# Altium schematic symbol library SignalCommunications.SCHLIB: 804 symbols (part 3 of 9) (continued)
## WE-RFI_1008 (continued)
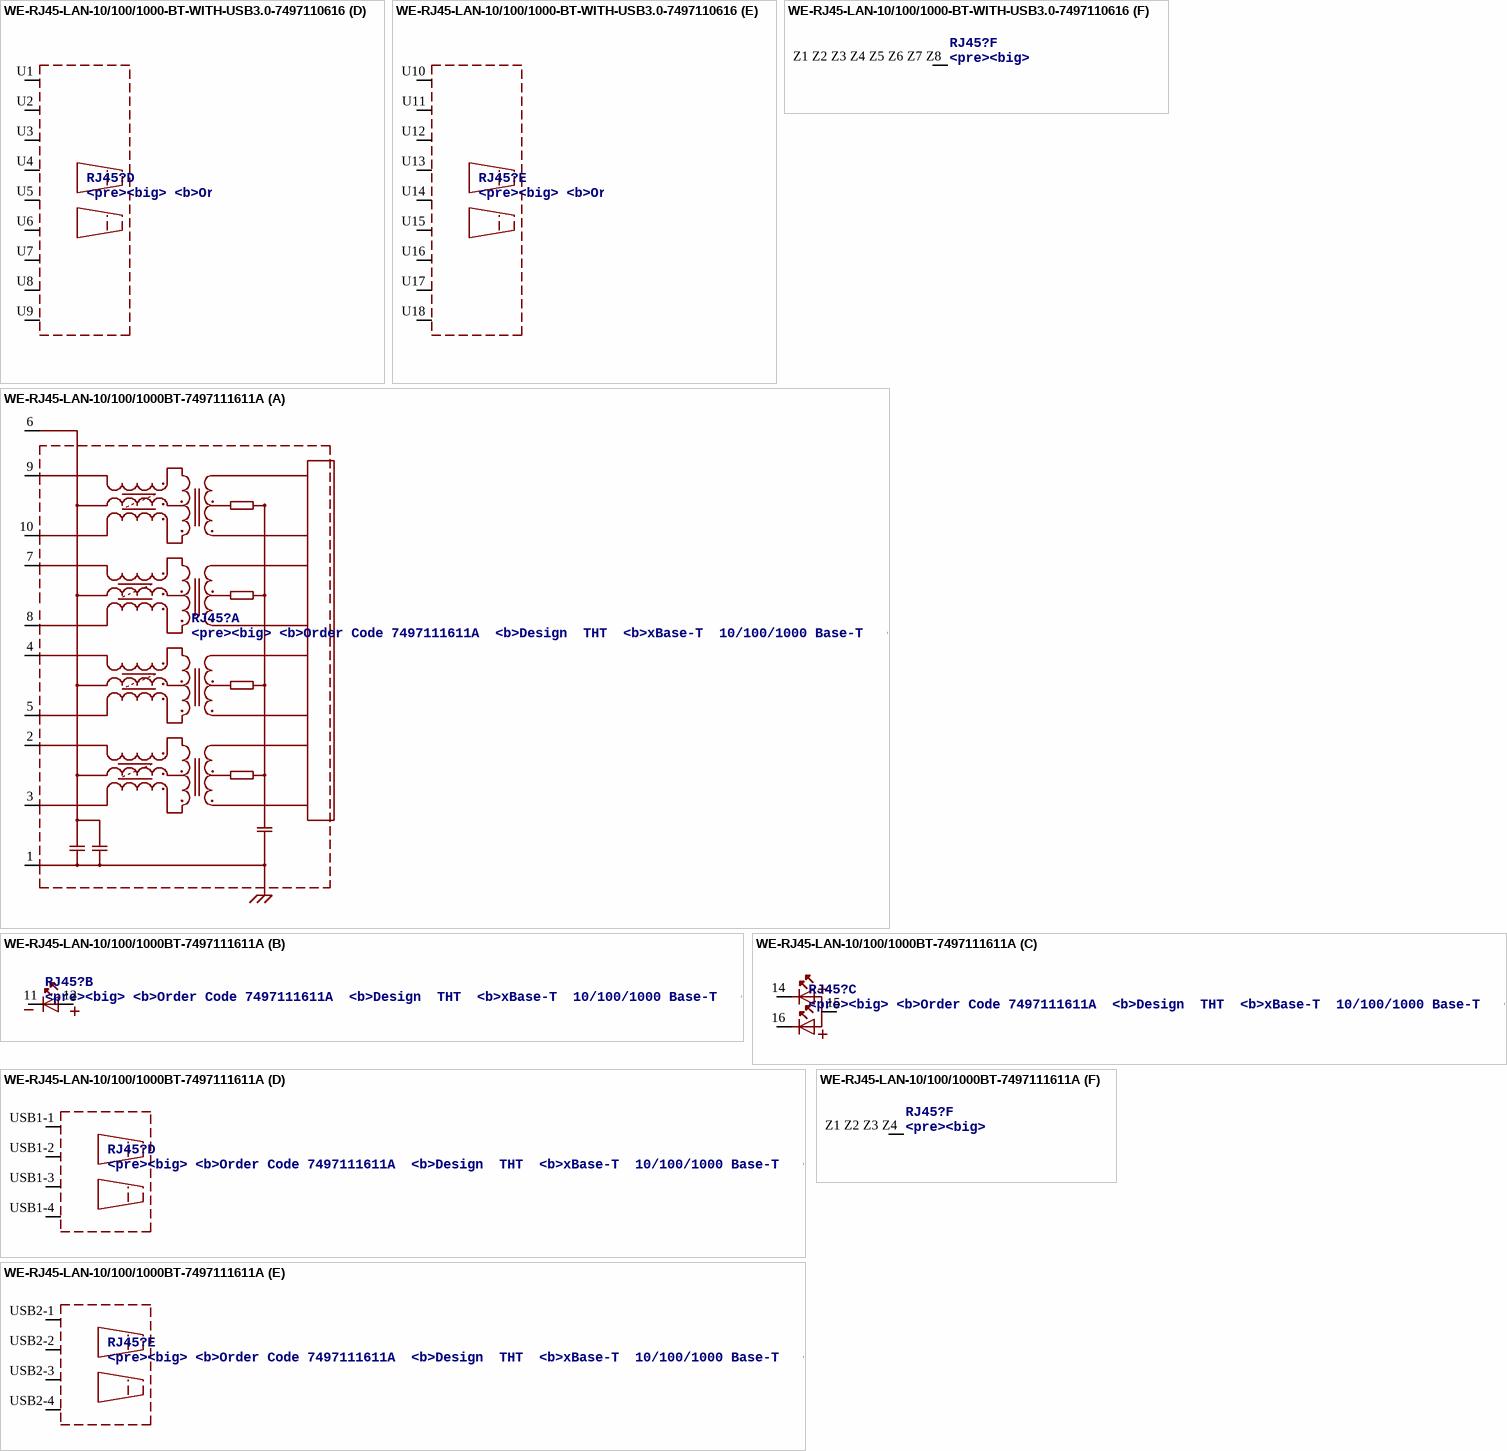
[diagram p12: symbols WE-RJ45-LAN-10/100/1000-BT-WITH-USB3.0-7497110616 to WE-RJ45-LAN-10/100/1000BT-7497111611A]

## WE-RJ45-LAN-10/100/1000-BT-WITH-USB3.0-7497110616
designator RJ45?, comment <pre><big> / <b>Order Code	7497110616 / <b>Design		THT / <b>xBase-T		10/100/1000 Base-T / <b>Ports		1x1 +2USB / <b>Application	Standard USB3.0 / <b>Tab Position	UP / <b>LED (Left-Right)	YELLOW-GREEN/OANGE / <b>EMI Fingers	NO
MANUFACTURER: Würth Elektronik eiSos GmbH; CREATED-BY: Christin Zierenner; COMPANY-URL: http://www.we-online.de; CREATED-DATE: AUG 2012; DATASHEET-URL: http://katalog.we-online.de/kataloge/eisos/media/pdf/7497110616.pdf
footprint 7497110616
part A pins: 1, 2, 3, 4, 5, 6, 7, 8, 9, 10 (power)
part B pins: 11 K, 12 A
part C pins: 13 AK1, 14 AK2
part D pins: U1 VCC (power), U2 D-, U3 D+, U4 GND (power), U5 RX-, U6 RX+, U7 GND_SIG (power), U8 TX-, U9 TX+
part E pins: U10 VCC (power), U11 D-, U12 D+, U13 GND (power), U14 RX-, U15 RX+, U16 GND_SIG (power), U17 TX-, U18 TX+
part F pins: Z1 Z2 Z3 Z4 Z5 Z6 Z7 Z8 P$1 (power)

## WE-RJ45-LAN-10/100/1000BT-7497111611A
designator RJ45?, comment <pre><big> / <b>Order Code	7497111611A / <b>Design		THT / <b>xBase-T		10/100/1000 Base-T / <b>Ports		1x1 + 2xUSB / <b>Application	Standard USB2.0 / <b>Tab Position	UP / <b>LED (Left-Right)	GREEN/ORANGE-YELLOW / <b>EMI Fingers	YES
MANUFACTURER: Würth Elektronik eiSos GmbH; CREATED-BY: Christin Zierenner; COMPANY-URL: http://www.we-online.de; CREATED-DATE: AUG 2012; DATASHEET-URL: http://katalog.we-online.de/kataloge/eisos/media/pdf/7497111611A.pdf
footprint 7497111611A
part A pins: 1 (power), 2, 3, 4, 5, 6, 7, 8, 9, 10
part B pins: 11 K, 12 A
part C pins: 14 K1, 15 A1, 16 K2
part D pins: USB1-1 VCC (power), USB1-2 D-, USB1-3 D+, USB1-4 GND (power)
part E pins: USB2-1 VCC (power), USB2-2 D-, USB2-3 D+, USB2-4 GND (power)
part F pins: Z1 Z2 Z3 Z4 P$1 (power)

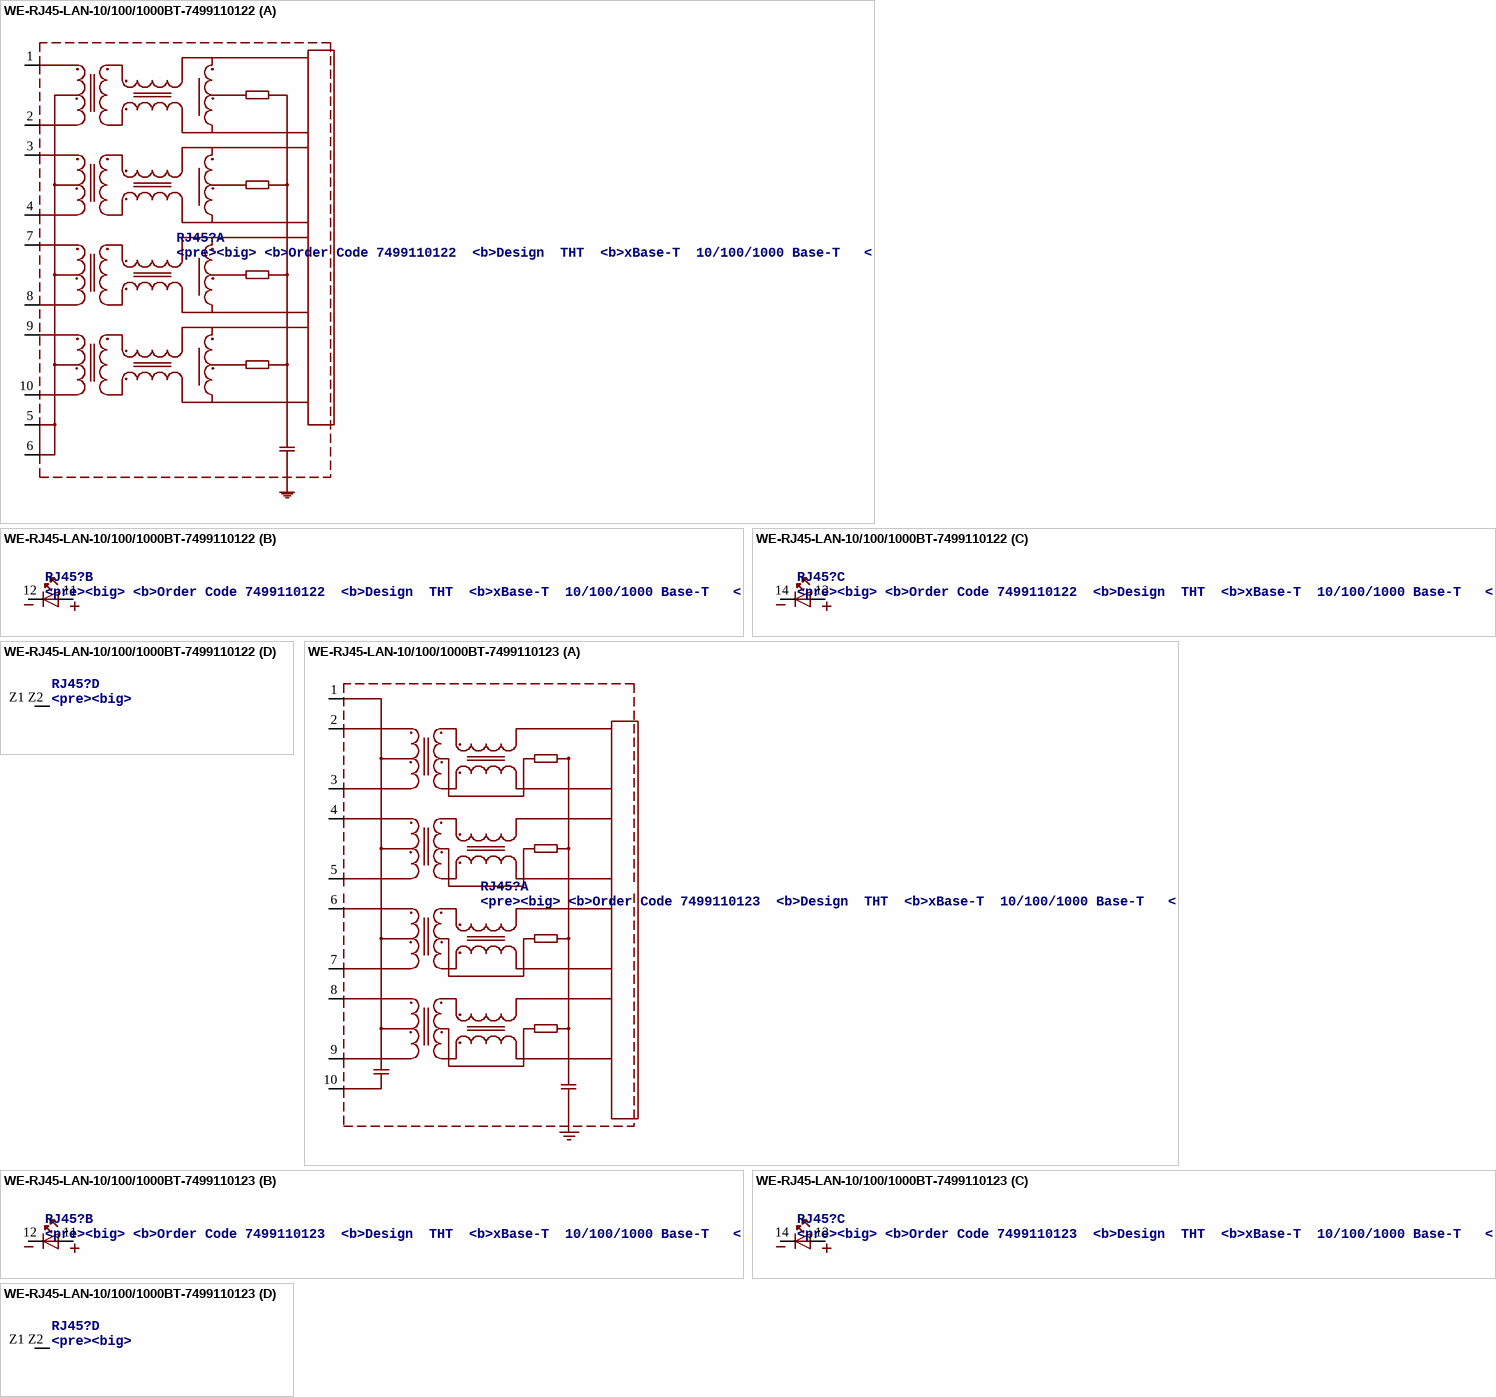
[diagram p13: symbols WE-RJ45-LAN-10/100/1000BT-7499110122 to WE-RJ45-LAN-10/100/1000BT-7499110123]

## WE-RJ45-LAN-10/100/1000BT-7499110122
designator RJ45?, comment <pre><big> / <b>Order Code	7499110122 / <b>Design		THT / <b>xBase-T		10/100/1000 Base-T / <b>Ports		1x1 / <b>Application	Standard / <b>Tab Position	Down / <b>LED (Left-Right)	YELLOW-GREEN / <b>EMI Fingers	No
MANUFACTURER: Würth Elektronik eiSos GmbH; CREATED-BY: Christin Zierenner; COMPANY-URL: http://www.we-online.de; CREATED-DATE: AUG 2012; DATASHEET-URL: http://katalog.we-online.de/kataloge/eisos/media/pdf/7499110122.pdf
footprint 7499110122
part A pins: 1, 2, 3, 4, 5, 6, 7, 8, 9, 10
part B pins: 11 A, 12 K
part C pins: 13 A, 14 K
part D pins: Z1 Z2 P$1 (power)

## WE-RJ45-LAN-10/100/1000BT-7499110123
designator RJ45?, comment <pre><big> / <b>Order Code	7499110123 / <b>Design		THT / <b>xBase-T		10/100/1000 Base-T / <b>Ports		1x1 / <b>Application	Standard / <b>Tab Position	VERTICAL / <b>LED (Left-Right)	YELLOW-GREEN / <b>EMI Fingers	No
MANUFACTURER: Würth Elektronik eiSos GmbH; CREATED-BY: Christin Zierenner; COMPANY-URL: http://www.we-online.de; CREATED-DATE: AUG 2012; DATASHEET-URL: http://katalog.we-online.de/kataloge/eisos/media/pdf/7499110123.pdf
footprint 7499110123
part A pins: 1, 2, 3, 4, 5, 6, 7, 8, 9, 10
part B pins: 11 A, 12 K
part C pins: 13 A, 14 K
part D pins: Z1 Z2 P$1 (power)

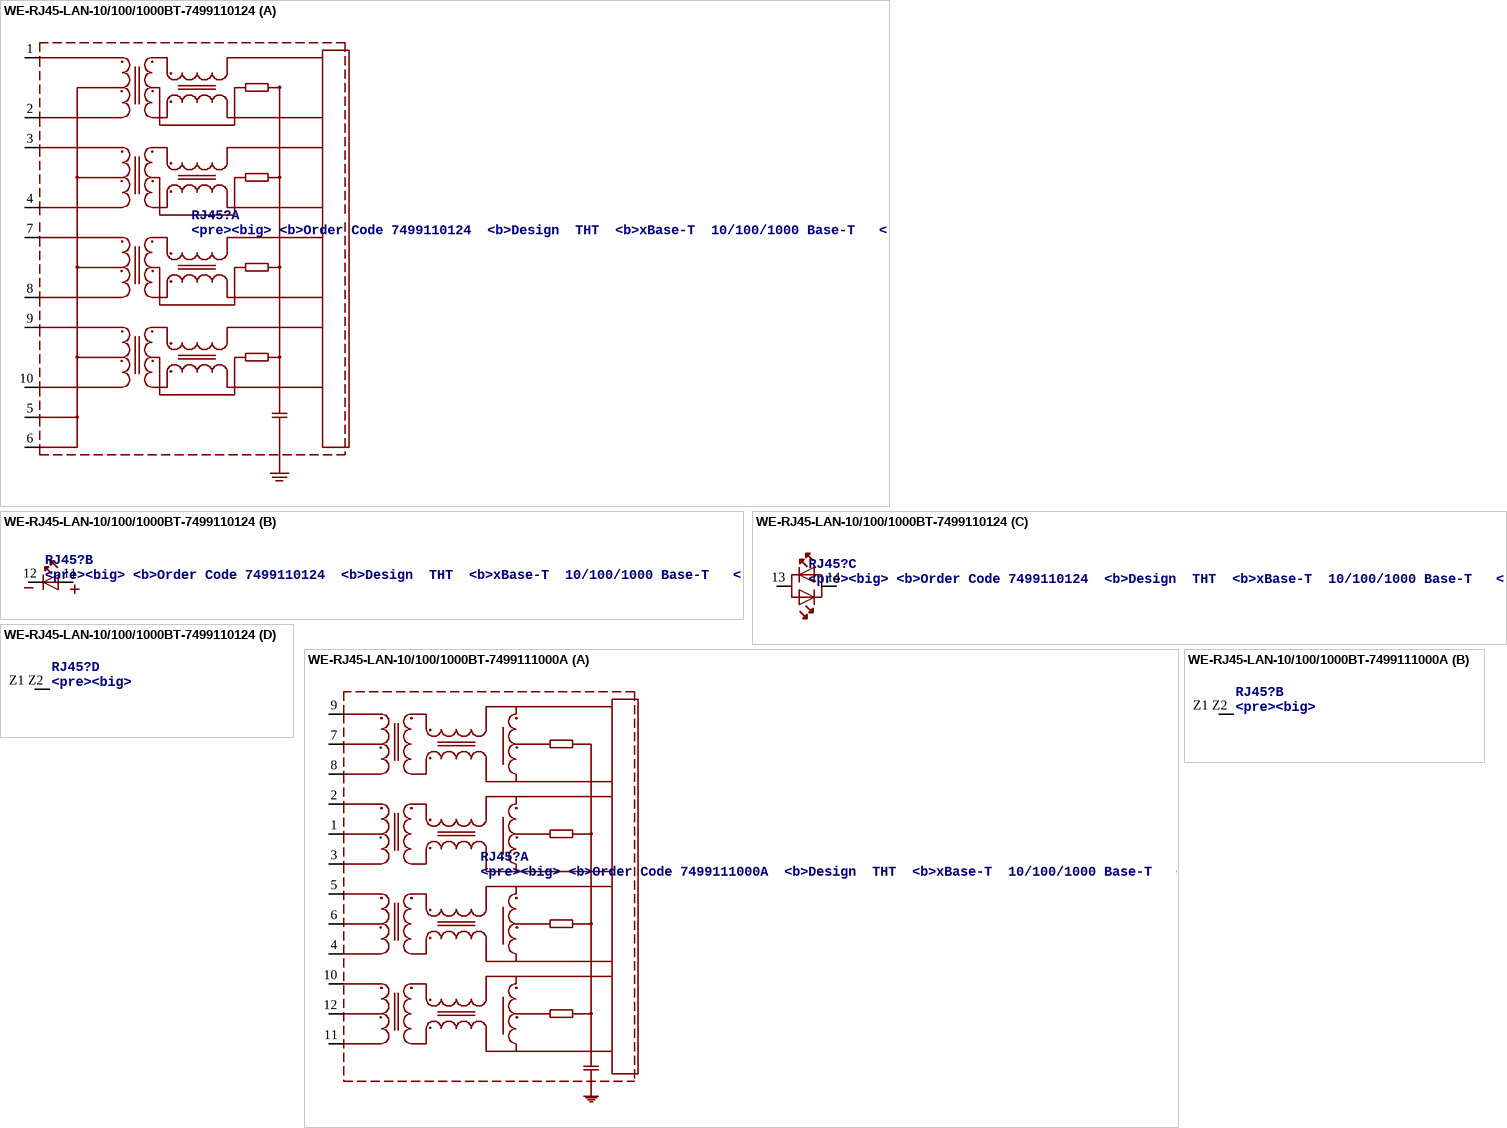
[diagram p14: symbols WE-RJ45-LAN-10/100/1000BT-7499110124 to WE-RJ45-LAN-10/100/1000BT-7499111000A]

## WE-RJ45-LAN-10/100/1000BT-7499110124
designator RJ45?, comment <pre><big> / <b>Order Code	7499110124 / <b>Design		THT / <b>xBase-T		10/100/1000 Base-T / <b>Ports		1x1 / <b>Application	Standard / <b>Tab Position	UP / <b>LED (Left-Right)	GREEN/YELLOW-GREEN / <b>EMI Fingers	No
MANUFACTURER: Würth Elektronik eiSos GmbH; CREATED-BY: Christin Zierenner; COMPANY-URL: http://www.we-online.de; CREATED-DATE: AUG 2012; DATASHEET-URL: http://katalog.we-online.de/kataloge/eisos/media/pdf/7499110124.pdf
footprint 7499110124
part A pins: 1, 2, 3, 4, 5, 6, 7, 8, 9, 10
part B pins: 11 A, 12 K
part C pins: 13 AK1, 14 AK2
part D pins: Z1 Z2 P$1 (power)

## WE-RJ45-LAN-10/100/1000BT-7499111000A
designator RJ45?, comment <pre><big> / <b>Order Code	7499111000A / <b>Design		THT / <b>xBase-T		10/100/1000 Base-T / <b>Ports		1x1 / <b>Application	Standard / <b>Tab Position	UP / <b>LED (Left-Right)	NONE / <b>EMI Fingers	Yes
MANUFACTURER: Würth Elektronik eiSos GmbH; CREATED-BY: Christin Zierenner; COMPANY-URL: http://www.we-online.de; CREATED-DATE: AUG 2012; DATASHEET-URL: http://katalog.we-online.de/kataloge/eisos/media/pdf/7499111000A.pdf
footprint 7499111000A
part A pins: 1, 2, 3, 4, 5, 6, 7, 8, 9, 10, 11, 12
part B pins: Z1 Z2 P$1 (power)

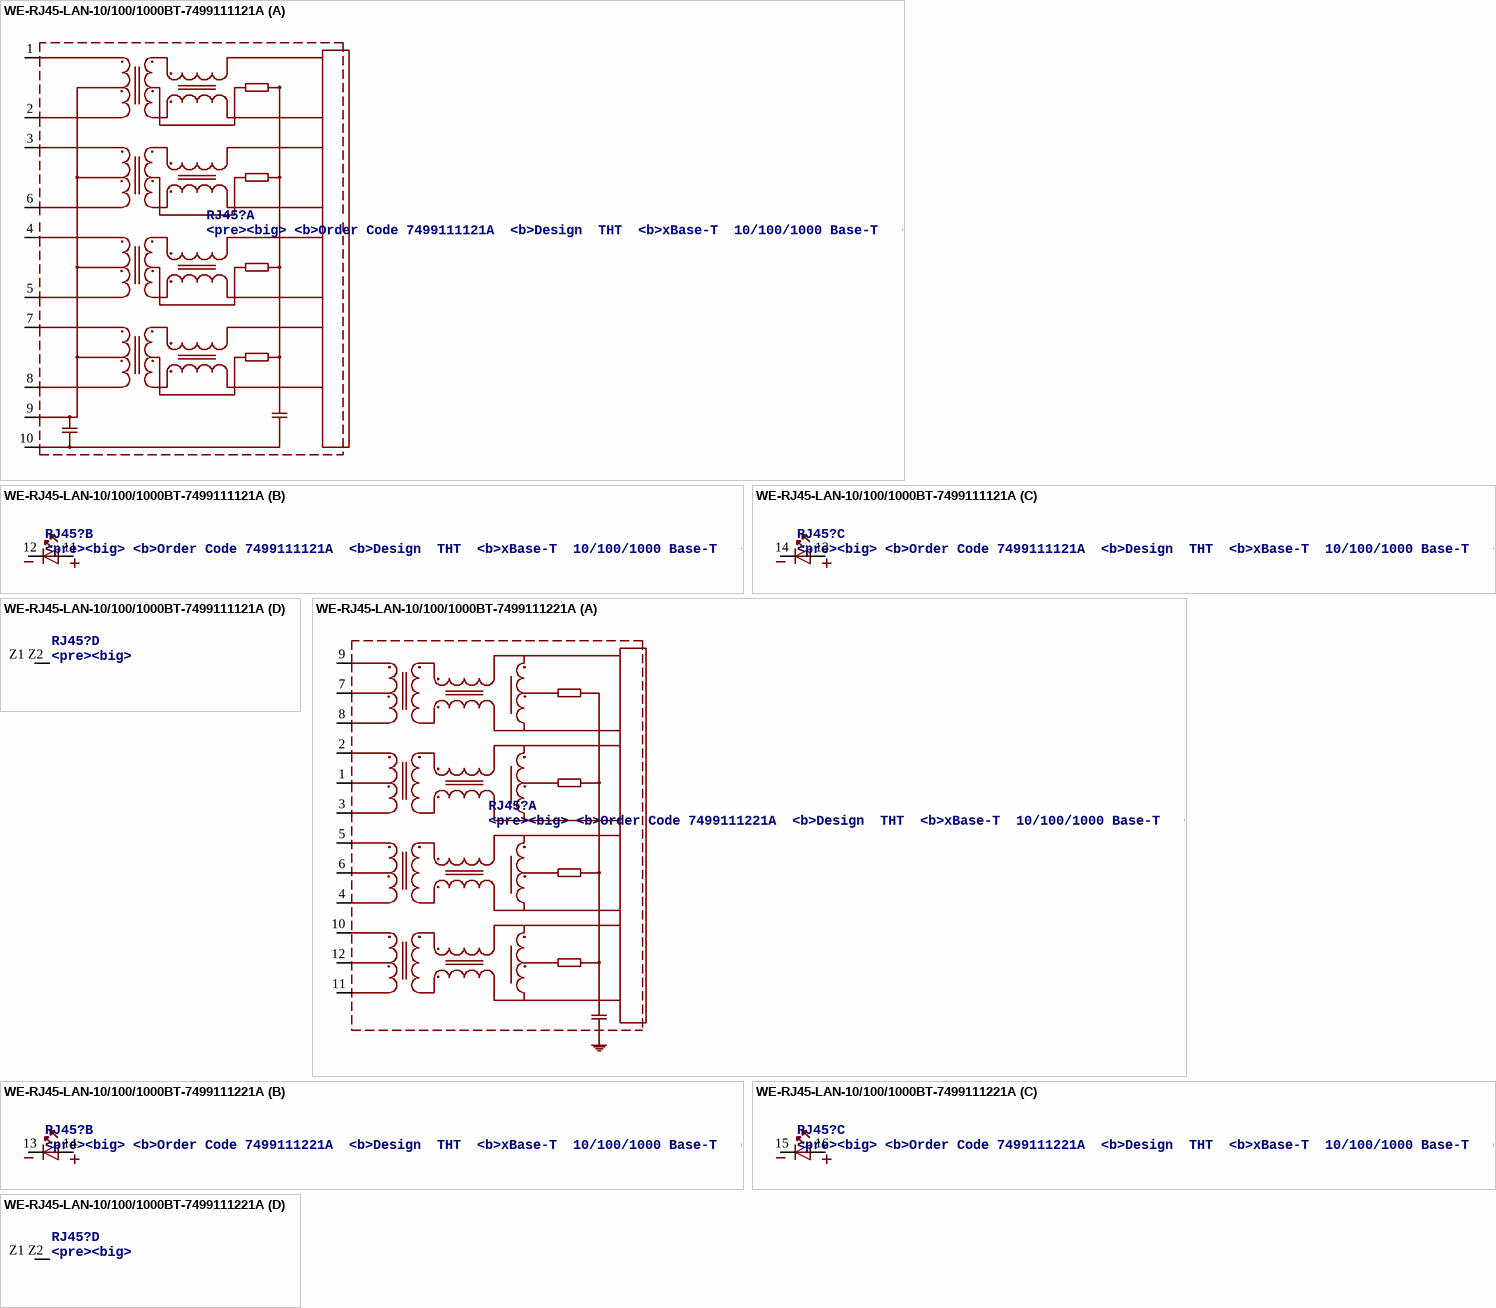
[diagram p15: symbols WE-RJ45-LAN-10/100/1000BT-7499111121A to WE-RJ45-LAN-10/100/1000BT-7499111221A]

## WE-RJ45-LAN-10/100/1000BT-7499111121A
designator RJ45?, comment <pre><big> / <b>Order Code	7499111121A / <b>Design		THT / <b>xBase-T		10/100/1000 Base-T / <b>Ports		1x1 / <b>Application	Standard / <b>Tab Position	DOWN / <b>LED (Left-Right)	YELLOW-GREEN / <b>EMI Fingers	Yes
MANUFACTURER: Würth Elektronik eiSos GmbH; CREATED-BY: Christin Zierenner; COMPANY-URL: http://www.we-online.de; CREATED-DATE: AUG 2012; DATASHEET-URL: http://katalog.we-online.de/kataloge/eisos/media/pdf/7499111121A.pdf
footprint 7499111121A
part A pins: 1, 2, 3, 4, 5, 6, 7, 8, 9 (power), 10 (power)
part B pins: 11 A, 12 K
part C pins: 13 A, 14 K
part D pins: Z1 Z2 P$1 (power)

## WE-RJ45-LAN-10/100/1000BT-7499111221A
designator RJ45?, comment <pre><big> / <b>Order Code	7499111221A / <b>Design		THT / <b>xBase-T		10/100/1000 Base-T / <b>Ports		1x1 / <b>Application	Standard / <b>Tab Position	UP / <b>LED (Left-Right)	GREEN-GREEN / <b>EMI Fingers	Yes
MANUFACTURER: Würth Elektronik eiSos GmbH; CREATED-BY: Christin Zierenner; COMPANY-URL: http://www.we-online.de; CREATED-DATE: AUG 2012; DATASHEET-URL: http://katalog.we-online.de/kataloge/eisos/media/pdf/7499111221A.pdf
footprint 7499111221A
part A pins: 1, 2, 3, 4, 5, 6, 7, 8, 9, 10, 11, 12
part B pins: 13 K, 14 A
part C pins: 15 K, 16 A
part D pins: Z1 Z2 P$1 (power)

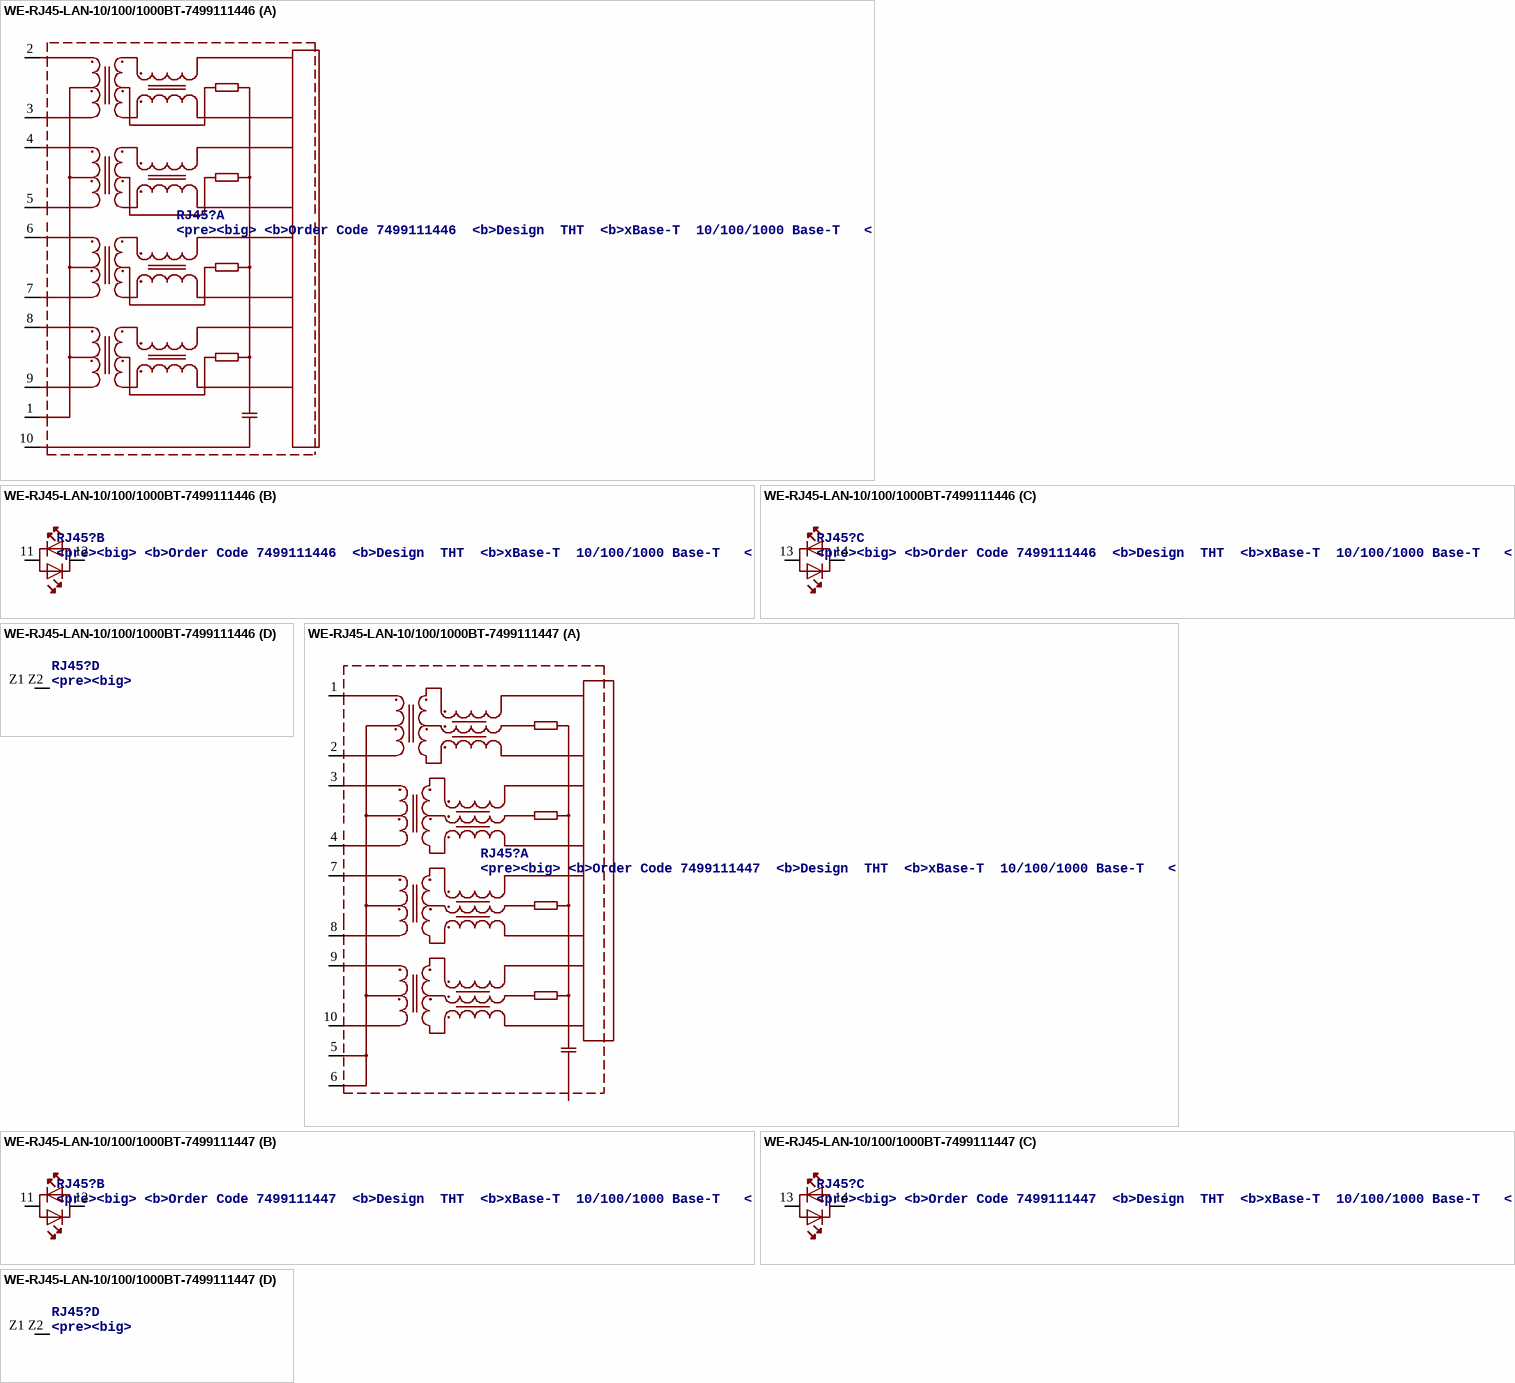
[diagram p16: symbols WE-RJ45-LAN-10/100/1000BT-7499111446 to WE-RJ45-LAN-10/100/1000BT-7499111447]

## WE-RJ45-LAN-10/100/1000BT-7499111446
designator RJ45?, comment <pre><big> / <b>Order Code	7499111446 / <b>Design		THT / <b>xBase-T		10/100/1000 Base-T / <b>Ports		1x1 / <b>Application	Standard / <b>Tab Position	DOWN / <b>LED (Left-Right)	GREEN/YELLOW-GREEN/YELLOW / <b>EMI Fingers	yes
MANUFACTURER: Würth Elektronik eiSos GmbH; CREATED-BY: Christin Zierenner; COMPANY-URL: http://www.we-online.de; CREATED-DATE: AUG 2012; DATASHEET-URL: http://katalog.we-online.de/kataloge/eisos/media/pdf/7499111446.pdf
footprint 7499111446
part A pins: 1, 2, 3, 4, 5, 6, 7, 8, 9, 10 (power)
part B pins: 11 AK1, 12 AK2
part C pins: 13 AK1, 14 AK2
part D pins: Z1 Z2 P$1 (power)

## WE-RJ45-LAN-10/100/1000BT-7499111447
designator RJ45?, comment <pre><big> / <b>Order Code	7499111447 / <b>Design		THT / <b>xBase-T		10/100/1000 Base-T / <b>Ports		1x1 / <b>Application	Standard / <b>Tab Position	Up / <b>LED (Left-Right)	GREEN/YELLOW-GREEN/YELLOW / <b>EMI Fingers	yes
MANUFACTURER: Würth Elektronik eiSos GmbH; CREATED-BY: Christin Zierenner; COMPANY-URL: http://www.we-online.de; CREATED-DATE: AUG 2012; DATASHEET-URL: http://katalog.we-online.de/kataloge/eisos/media/pdf/7499111447.pdf
footprint 7499111447
part A pins: 1, 2, 3, 4, 5, 6, 7, 8, 9, 10
part B pins: 11 AK1, 12 AK2
part C pins: 13 AK1, 14 AK2
part D pins: Z1 Z2 P$1 (power)

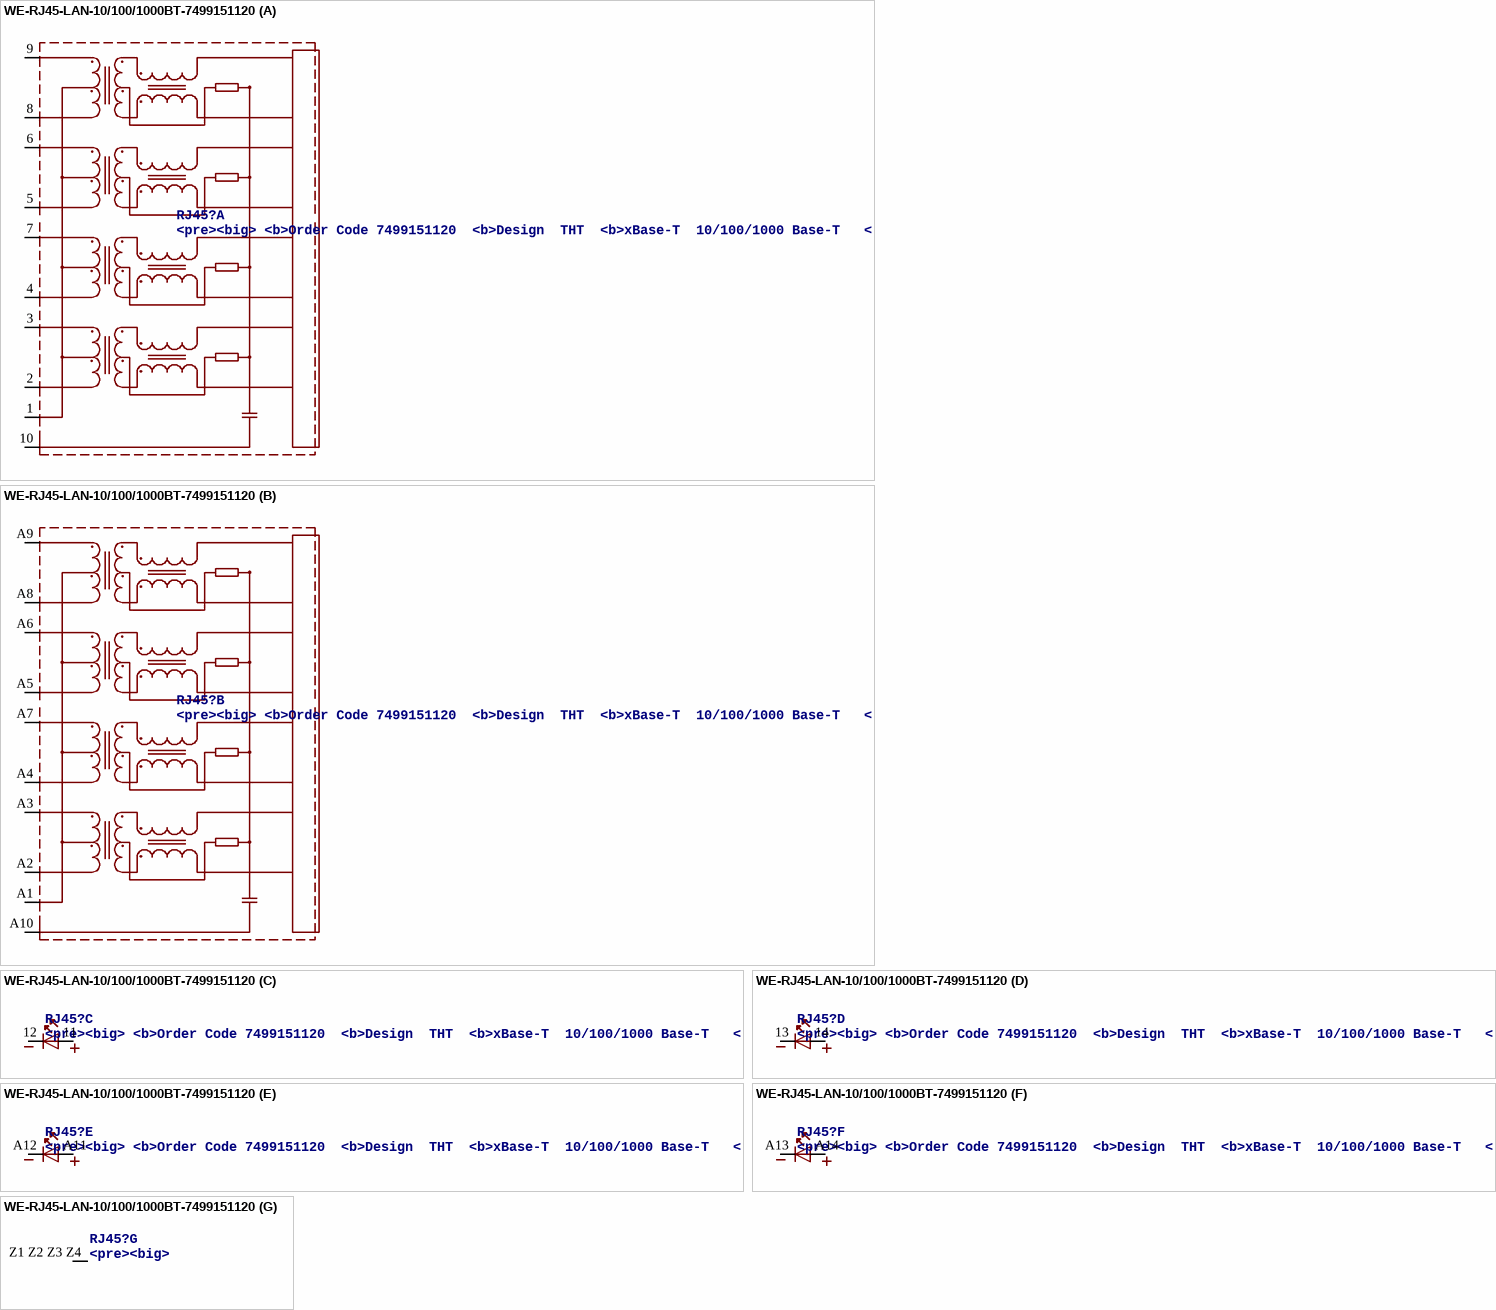
[diagram p17: symbol WE-RJ45-LAN-10/100/1000BT-7499151120]

## WE-RJ45-LAN-10/100/1000BT-7499151120
designator RJ45?, comment <pre><big> / <b>Order Code	7499151120 / <b>Design		THT / <b>xBase-T		10/100/1000 Base-T / <b>Ports		1x2 Stacked / <b>Application	Standard / <b>Tab Position	UP & DOWN / <b>LED (Left-Right)	YELLOW-GREEN / <b>EMI Fingers	Yes
MANUFACTURER: Würth Elektronik eiSos GmbH; CREATED-BY: Christin Zierenner; COMPANY-URL: http://www.we-online.de; CREATED-DATE: AUG 2012; DATASHEET-URL: http://katalog.we-online.de/kataloge/eisos/media/pdf/7499151120.pdf
footprint 7499151120
part A pins: 1, 2, 3, 4, 5, 6, 7, 8, 9, 10 SHIELD (power)
part B pins: A1 1, A2 2, A3 3, A4 4, A5 5, A6 6, A7 7, A8 8, A9 9, A10 SHIELD (power)
part C pins: 11 A, 12 K
part D pins: 13 K, 14 A
part E pins: A11 A, A12 K
part F pins: A13 K, A14 A
part G pins: Z1 Z2 Z3 Z4 P$1 (power)

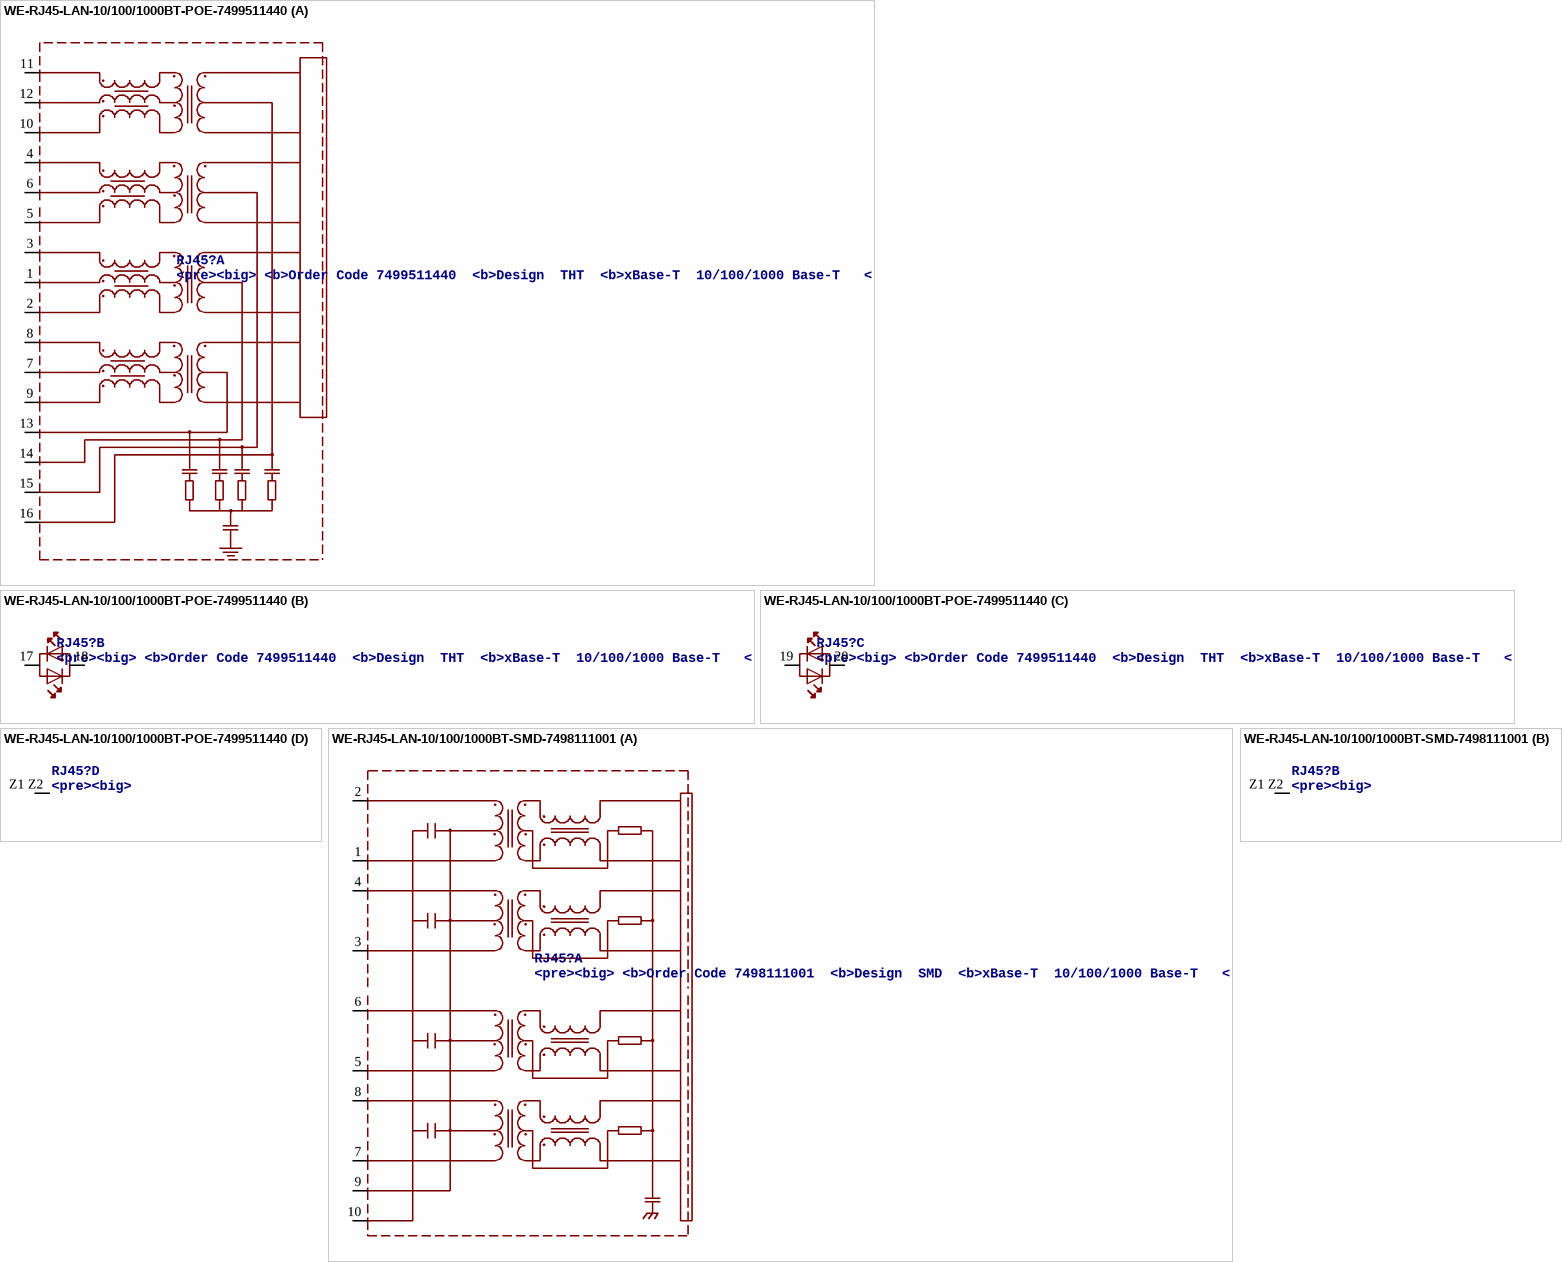
[diagram p18: symbols WE-RJ45-LAN-10/100/1000BT-POE-7499511440 to WE-RJ45-LAN-10/100/1000BT-SMD-7498111001]

## WE-RJ45-LAN-10/100/1000BT-POE-7499511440
designator RJ45?, comment <pre><big> / <b>Order Code	7499511440 / <b>Design		THT / <b>xBase-T		10/100/1000 Base-T / <b>Ports		1x1 / <b>Application	PoE / <b>Tab Position	UP / <b>LED (Left-Right)	GREEN/YELLOW-GREEN/YELLOW / <b>EMI Fingers	Yes
MANUFACTURER: Würth Elektronik eiSos GmbH; CREATED-BY: Christin Zierenner; COMPANY-URL: http://www.we-online.de; CREATED-DATE: AUG 2012; DATASHEET-URL: http://katalog.we-online.de/kataloge/eisos/media/pdf/7499511440.pdf
footprint 7499511440
part A pins: 1, 2, 3, 4, 5, 6, 7, 8, 9, 10, 11, 12, 13 VC1+1 (power), 14 VC1-1 (power), 15 VC2+1 (power), 16 VC2-1 (power)
part B pins: 17 AK1, 18 AK2
part C pins: 19 AK1, 20 AK2
part D pins: Z1 Z2 P$1 (power)

## WE-RJ45-LAN-10/100/1000BT-SMD-7498111001
designator RJ45?, comment <pre><big> / <b>Order Code	7498111001 / <b>Design		SMD / <b>xBase-T		10/100/1000 Base-T / <b>Ports		1x1 / <b>Application	Standard / <b>Tab Position	UP / <b>LED (Left-Right)	NONE / <b>EMI Fingers	Yes
MANUFACTURER: Würth Elektronik eiSos GmbH; CREATED-BY: Christin Zierenner; COMPANY-URL: http://www.we-online.de; CREATED-DATE: AUG 2012; DATASHEET-URL: http://katalog.we-online.de/kataloge/eisos/media/pdf/7498111001.pdf
footprint 7498111001
part A pins: 1, 2, 3, 4, 5, 6, 7, 8, 9 VCC (power), 10 GND (power)
part B pins: Z1 Z2 P$1 (power)
